# Altium schematic symbol library jlcpcb_2025_04_inductors_extended_0603.schlib: 1269 symbols (part 4 of 7)
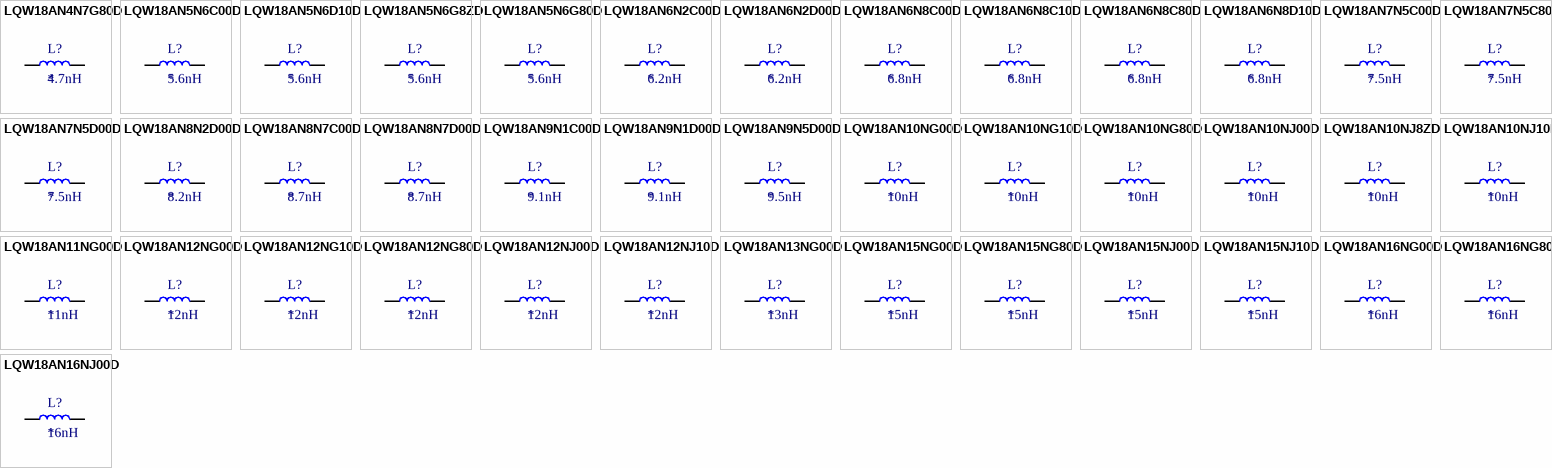
[diagram p34: symbols LQW18AN4N7G80D to LQW18AN16NJ00D]

## LQW18AN6N8C80D
designator L?  Inductance: 6.8nH
Inductor, 6.8nH, 40mΩ, 1.9A, SMD 0603; Manufacturer: Murata Electronics; Manufacturer Part Number: LQW18AN6N8C80D; Package Size: 0603; JLCPCB Basic Part: No; JLCPCB Part Number: C2050361; Supplier 1: LCSC; Category: Inductors; Supplier Part Number 1: C2050361; Rated Current: 1.9A; DC Resistance: 40mΩ; RoHS: Yes; ComponentLink1Description: Datasheet; ComponentLink1URL: https://wmsc.lcsc.com/wmsc/upload/file/pdf/v2/lcsc/2304140030_Murata-Electronics-LQW18AN6N8C80D_C2050361.pdf; ComponentLink2Description: JLCPCB Part URL; ComponentLink2URL: https://jlcpcb.com/partdetail/C2050361; ComponentLink3Description: LCSC Part URL; ComponentLink3URL: https://lcsc.com/product-detail/Power-Inductors_Murata-Electronics-Murata-Electronics-LQW18AN6N8C80D_C2050361.html
footprint IND-0603 (0603 (1608M) Inductor)
pins: 1, 2

## LQW18AN6N8D10D
designator L?  Inductance: 6.8nH
Inductor, 6.8nH, 45mΩ, SMD 0603; Manufacturer: Murata Electronics; Manufacturer Part Number: LQW18AN6N8D10D; Self-Resonant Frequency: 7GHz; Q Factor: 38@250MHz; Package Size: 0603; JLCPCB Basic Part: No; JLCPCB Part Number: C341790; Supplier 1: LCSC; Category: Inductors; Supplier Part Number 1: C341790; DC Resistance: 45mΩ; RoHS: Yes; ComponentLink1Description: Datasheet; ComponentLink1URL: https://wmsc.lcsc.com/wmsc/upload/file/pdf/v2/lcsc/2304140030_Murata-Electronics-LQW18AN6N8D10D_C341790.pdf; ComponentLink2Description: JLCPCB Part URL; ComponentLink2URL: https://jlcpcb.com/partdetail/C341790; ComponentLink3Description: LCSC Part URL; ComponentLink3URL: https://lcsc.com/product-detail/Inductors-SMD_Murata-Electronics-Murata-Electronics-LQW18AN6N8D10D_C341790.html
footprint IND-0603 (0603 (1608M) Inductor)
pins: 1, 2

## LQW18AN7N5C00D
designator L?  Inductance: 7.5nH
Inductor, 7.5nH, 82mΩ, 750mA, SMD 0603; Manufacturer: Murata Electronics; Manufacturer Part Number: LQW18AN7N5C00D; Self-Resonant Frequency: 6GHz; Q Factor: 35@250MHz; Package Size: 0603; JLCPCB Basic Part: No; JLCPCB Part Number: C341696; Supplier 1: LCSC; Category: Inductors; Supplier Part Number 1: C341696; Rated Current: 750mA; DC Resistance: 82mΩ; RoHS: Yes; ComponentLink1Description: Datasheet; ComponentLink1URL: https://wmsc.lcsc.com/wmsc/upload/file/pdf/v2/lcsc/2304140030_Murata-Electronics-LQW18AN7N5C00D_C341696.pdf; ComponentLink2Description: JLCPCB Part URL; ComponentLink2URL: https://jlcpcb.com/partdetail/C341696; ComponentLink3Description: LCSC Part URL; ComponentLink3URL: https://lcsc.com/product-detail/Inductors-SMD_Murata-Electronics-Murata-Electronics-LQW18AN7N5C00D_C341696.html
footprint IND-0603 (0603 (1608M) Inductor)
pins: 1, 2

## LQW18AN7N5C80D
designator L?  Inductance: 7.5nH
Inductor, 7.5nH, 48mΩ, 1.5A, SMD 0603; Manufacturer: Murata Electronics; Manufacturer Part Number: LQW18AN7N5C80D; Package Size: 0603; JLCPCB Basic Part: No; JLCPCB Part Number: C3223406; Supplier 1: LCSC; Category: Inductors; Supplier Part Number 1: C3223406; Rated Current: 1.5A; DC Resistance: 48mΩ; RoHS: Yes; ComponentLink1Description: Datasheet; ComponentLink1URL: https://wmsc.lcsc.com/wmsc/upload/file/pdf/v2/lcsc/2308111531_Murata-Electronics-LQW18AN7N5C80D_C3223406.pdf; ComponentLink2Description: JLCPCB Part URL; ComponentLink2URL: https://jlcpcb.com/partdetail/C3223406; ComponentLink3Description: LCSC Part URL; ComponentLink3URL: https://lcsc.com/product-detail/Power-Inductors_Murata-Electronics-Murata-Electronics-LQW18AN7N5C80D_C3223406.html
footprint IND-0603 (0603 (1608M) Inductor)
pins: 1, 2

## LQW18AN7N5D00D
designator L?  Inductance: 7.5nH
Inductor, 7.5nH, 82mΩ, SMD 0603; Manufacturer: Murata Electronics; Manufacturer Part Number: LQW18AN7N5D00D; Self-Resonant Frequency: 6GHz; Q Factor: 35@250MHz; Package Size: 0603; JLCPCB Basic Part: No; JLCPCB Part Number: C98084; Supplier 1: LCSC; Category: Inductors; Supplier Part Number 1: C98084; DC Resistance: 82mΩ; RoHS: Yes; ComponentLink1Description: Datasheet; ComponentLink1URL: https://wmsc.lcsc.com/wmsc/upload/file/pdf/v2/lcsc/2304140030_Murata-Electronics-LQW18AN7N5D00D_C98084.pdf; ComponentLink2Description: JLCPCB Part URL; ComponentLink2URL: https://jlcpcb.com/partdetail/C98084; ComponentLink3Description: LCSC Part URL; ComponentLink3URL: https://lcsc.com/product-detail/Inductors-SMD_Murata-Electronics-Murata-Electronics-LQW18AN7N5D00D_C98084.html
footprint IND-0603 (0603 (1608M) Inductor)
pins: 1, 2

## LQW18AN8N2D00D
designator L?  Inductance: 8.2nH
Inductor, 8.2nH, 110mΩ, 650mA, SMD 0603; Manufacturer: Murata Electronics; Manufacturer Part Number: LQW18AN8N2D00D; Self-Resonant Frequency: 6GHz; Q Factor: 35@250MHz; Package Size: 0603; JLCPCB Basic Part: No; JLCPCB Part Number: C98087; Supplier 1: LCSC; Category: Inductors; Supplier Part Number 1: C98087; Rated Current: 650mA; DC Resistance: 110mΩ; RoHS: Yes; ComponentLink1Description: Datasheet; ComponentLink1URL: https://wmsc.lcsc.com/wmsc/upload/file/pdf/v2/lcsc/2304140030_Murata-Electronics-LQW18AN8N2D00D_C98087.pdf; ComponentLink2Description: JLCPCB Part URL; ComponentLink2URL: https://jlcpcb.com/partdetail/C98087; ComponentLink3Description: LCSC Part URL; ComponentLink3URL: https://lcsc.com/product-detail/Inductors-SMD_Murata-Electronics-Murata-Electronics-LQW18AN8N2D00D_C98087.html
footprint IND-0603 (0603 (1608M) Inductor)
pins: 1, 2

## LQW18AN8N7C00D
designator L?  Inductance: 8.7nH
Inductor, 8.7nH, 110mΩ, 650mA, SMD 0603; Manufacturer: Murata Electronics; Manufacturer Part Number: LQW18AN8N7C00D; Self-Resonant Frequency: 6GHz; Q Factor: 35@250MHz; Package Size: 0603; JLCPCB Basic Part: No; JLCPCB Part Number: C86137; Supplier 1: LCSC; Category: Inductors; Supplier Part Number 1: C86137; Rated Current: 650mA; DC Resistance: 110mΩ; RoHS: Yes; ComponentLink1Description: Datasheet; ComponentLink1URL: https://wmsc.lcsc.com/wmsc/upload/file/pdf/v2/lcsc/1810311111_Murata-Electronics-LQW18AN8N7C00D_C86137.pdf; ComponentLink2Description: JLCPCB Part URL; ComponentLink2URL: https://jlcpcb.com/partdetail/C86137; ComponentLink3Description: LCSC Part URL; ComponentLink3URL: https://lcsc.com/product-detail/Inductors-SMD_Murata-Electronics-Murata-Electronics-LQW18AN8N7C00D_C86137.html
footprint IND-0603 (0603 (1608M) Inductor)
pins: 1, 2

## LQW18AN8N7D00D
designator L?  Inductance: 8.7nH
Inductor, 8.7nH, 110mΩ, 650mA, SMD 0603; Manufacturer: Murata Electronics; Manufacturer Part Number: LQW18AN8N7D00D; Package Size: 0603; JLCPCB Basic Part: No; JLCPCB Part Number: C701180; Supplier 1: LCSC; Category: Inductors; Supplier Part Number 1: C701180; Rated Current: 650mA; DC Resistance: 110mΩ; RoHS: Yes; ComponentLink1Description: Datasheet; ComponentLink1URL: https://wmsc.lcsc.com/wmsc/upload/file/pdf/v2/lcsc/2009291135_Murata-Electronics-LQW18AN8N7D00D_C701180.pdf; ComponentLink2Description: JLCPCB Part URL; ComponentLink2URL: https://jlcpcb.com/partdetail/C701180; ComponentLink3Description: LCSC Part URL; ComponentLink3URL: https://lcsc.com/product-detail/Power-Inductors_Murata-Electronics-Murata-Electronics-LQW18AN8N7D00D_C701180.html
footprint IND-0603 (0603 (1608M) Inductor)
pins: 1, 2

## LQW18AN9N1C00D
designator L?  Inductance: 9.1nH
Inductor, 9.1nH, 110mΩ, 650mA, SMD 0603; Manufacturer: Murata Electronics; Manufacturer Part Number: LQW18AN9N1C00D; Package Size: 0603; JLCPCB Basic Part: No; JLCPCB Part Number: C701193; Supplier 1: LCSC; Category: Inductors; Supplier Part Number 1: C701193; Rated Current: 650mA; DC Resistance: 110mΩ; RoHS: Yes; ComponentLink1Description: Datasheet; ComponentLink1URL: https://wmsc.lcsc.com/wmsc/upload/file/pdf/v2/lcsc/2009241508_Murata-Electronics-LQW18AN9N1C00D_C701193.pdf; ComponentLink2Description: JLCPCB Part URL; ComponentLink2URL: https://jlcpcb.com/partdetail/C701193; ComponentLink3Description: LCSC Part URL; ComponentLink3URL: https://lcsc.com/product-detail/Power-Inductors_Murata-Electronics-Murata-Electronics-LQW18AN9N1C00D_C701193.html
footprint IND-0603 (0603 (1608M) Inductor)
pins: 1, 2

## LQW18AN9N1D00D
designator L?  Inductance: 9.1nH
Inductor, 9.1nH, 110mΩ, 650mA, SMD 0603; Manufacturer: Murata Electronics; Manufacturer Part Number: LQW18AN9N1D00D; Self-Resonant Frequency: 6GHz; Q Factor: 35@250MHz; Package Size: 0603; JLCPCB Basic Part: No; JLCPCB Part Number: C77125; Supplier 1: LCSC; Category: Inductors; Supplier Part Number 1: C77125; Rated Current: 650mA; DC Resistance: 110mΩ; RoHS: Yes; ComponentLink1Description: Datasheet; ComponentLink1URL: https://wmsc.lcsc.com/wmsc/upload/file/pdf/v2/lcsc/2304140030_Murata-Electronics-LQW18AN9N1D00D_C77125.pdf; ComponentLink2Description: JLCPCB Part URL; ComponentLink2URL: https://jlcpcb.com/partdetail/C77125; ComponentLink3Description: LCSC Part URL; ComponentLink3URL: https://lcsc.com/product-detail/Inductors-SMD_Murata-Electronics-Murata-Electronics-LQW18AN9N1D00D_C77125.html
footprint IND-0603 (0603 (1608M) Inductor)
pins: 1, 2

## LQW18AN9N5D00D
designator L?  Inductance: 9.5nH
Inductor, 9.5nH, 110mΩ, 650mA, SMD 0603; Manufacturer: Murata Electronics; Manufacturer Part Number: LQW18AN9N5D00D; Package Size: 0603; JLCPCB Basic Part: No; JLCPCB Part Number: C701179; Supplier 1: LCSC; Category: Inductors; Supplier Part Number 1: C701179; Rated Current: 650mA; DC Resistance: 110mΩ; RoHS: Yes; ComponentLink1Description: Datasheet; ComponentLink1URL: https://wmsc.lcsc.com/wmsc/upload/file/pdf/v2/lcsc/2009291135_Murata-Electronics-LQW18AN9N5D00D_C701179.pdf; ComponentLink2Description: JLCPCB Part URL; ComponentLink2URL: https://jlcpcb.com/partdetail/C701179; ComponentLink3Description: LCSC Part URL; ComponentLink3URL: https://lcsc.com/product-detail/Power-Inductors_Murata-Electronics-Murata-Electronics-LQW18AN9N5D00D_C701179.html
footprint IND-0603 (0603 (1608M) Inductor)
pins: 1, 2

## LQW18AN10NG00D
designator L?  Inductance: 10nH
Inductor, 10nH, ±2%, 110mΩ, 650mA, SMD 0603; Manufacturer: Murata Electronics; Manufacturer Part Number: LQW18AN10NG00D; Self-Resonant Frequency: 6GHz; Q Factor: 35@250MHz; Package Size: 0603; JLCPCB Basic Part: No; JLCPCB Part Number: C86131; Supplier 1: LCSC; Category: Inductors; Supplier Part Number 1: C86131; Tolerance: ±2%; Rated Current: 650mA; DC Resistance: 110mΩ; RoHS: Yes; ComponentLink1Description: Datasheet; ComponentLink1URL: https://wmsc.lcsc.com/wmsc/upload/file/pdf/v2/lcsc/1810311121_Murata-Electronics-LQW18AN10NG00D_C86131.pdf; ComponentLink2Description: JLCPCB Part URL; ComponentLink2URL: https://jlcpcb.com/partdetail/C86131; ComponentLink3Description: LCSC Part URL; ComponentLink3URL: https://lcsc.com/product-detail/Inductors-SMD_Murata-Electronics-Murata-Electronics-LQW18AN10NG00D_C86131.html
footprint IND-0603 (0603 (1608M) Inductor)
pins: 1, 2

## LQW18AN10NG10D
designator L?  Inductance: 10nH
Inductor, 10nH, ±2%, 58mΩ, 800mA, SMD 0603; Manufacturer: Murata Electronics; Manufacturer Part Number: LQW18AN10NG10D; Package Size: 0603; JLCPCB Basic Part: No; JLCPCB Part Number: C417140; Supplier 1: LCSC; Category: Inductors; Supplier Part Number 1: C417140; Tolerance: ±2%; Rated Current: 800mA; DC Resistance: 58mΩ; RoHS: Yes; ComponentLink1Description: Datasheet; ComponentLink1URL: https://wmsc.lcsc.com/wmsc/upload/file/pdf/v2/lcsc/2009241507_Murata-Electronics-LQW18AN10NG10D_C417140.pdf; ComponentLink2Description: JLCPCB Part URL; ComponentLink2URL: https://jlcpcb.com/partdetail/C417140; ComponentLink3Description: LCSC Part URL; ComponentLink3URL: https://lcsc.com/product-detail/Power-Inductors_Murata-Electronics-Murata-Electronics-LQW18AN10NG10D_C417140.html
footprint IND-0603 (0603 (1608M) Inductor)
pins: 1, 2

## LQW18AN10NG80D
designator L?  Inductance: 10nH
Inductor, 10nH, ±2%, 52mΩ, 1.6A, SMD 0603; Manufacturer: Murata Electronics; Manufacturer Part Number: LQW18AN10NG80D; Package Size: 0603; JLCPCB Basic Part: No; JLCPCB Part Number: C668467; Supplier 1: LCSC; Category: Inductors; Supplier Part Number 1: C668467; Tolerance: ±2%; Rated Current: 1.6A; DC Resistance: 52mΩ; RoHS: Yes; ComponentLink1Description: Datasheet; ComponentLink1URL: https://wmsc.lcsc.com/wmsc/upload/file/pdf/v2/lcsc/2107272240_Murata-Electronics-LQW18AN10NG80D_C668467.pdf; ComponentLink2Description: JLCPCB Part URL; ComponentLink2URL: https://jlcpcb.com/partdetail/C668467; ComponentLink3Description: LCSC Part URL; ComponentLink3URL: https://lcsc.com/product-detail/Power-Inductors_Murata-Electronics-Murata-Electronics-LQW18AN10NG80D_C668467.html
footprint IND-0603 (0603 (1608M) Inductor)
pins: 1, 2

## LQW18AN10NJ00D
designator L?  Inductance: 10nH
Inductor, 10nH, ±5%, 110mΩ, 650mA, SMD 0603; Manufacturer: Murata Electronics; Manufacturer Part Number: LQW18AN10NJ00D; Self-Resonant Frequency: 6GHz; Q Factor: 35@250MHz; Package Size: 0603; JLCPCB Basic Part: No; JLCPCB Part Number: C98067; Supplier 1: LCSC; Category: Inductors; Supplier Part Number 1: C98067; Tolerance: ±5%; Rated Current: 650mA; DC Resistance: 110mΩ; RoHS: Yes; ComponentLink1Description: Datasheet; ComponentLink1URL: https://wmsc.lcsc.com/wmsc/upload/file/pdf/v2/lcsc/2304140030_Murata-Electronics-LQW18AN10NJ00D_C98067.pdf; ComponentLink2Description: JLCPCB Part URL; ComponentLink2URL: https://jlcpcb.com/partdetail/C98067; ComponentLink3Description: LCSC Part URL; ComponentLink3URL: https://lcsc.com/product-detail/Inductors-SMD_Murata-Electronics-Murata-Electronics-LQW18AN10NJ00D_C98067.html
footprint IND-0603 (0603 (1608M) Inductor)
pins: 1, 2

## LQW18AN10NJ8ZD
designator L?  Inductance: 10nH
Inductor, 10nH, ±5%, 52mΩ, 1.6A, SMD 0603; Manufacturer: Murata Electronics; Manufacturer Part Number: LQW18AN10NJ8ZD; Self-Resonant Frequency: 4.75GHz; Q Factor: 38@250MHz; Package Size: 0603; JLCPCB Basic Part: No; JLCPCB Part Number: C1329668; Supplier 1: LCSC; Category: Inductors; Supplier Part Number 1: C1329668; Tolerance: ±5%; Rated Current: 1.6A; DC Resistance: 52mΩ; RoHS: Yes; ComponentLink1Description: Datasheet; ComponentLink1URL: https://wmsc.lcsc.com/wmsc/upload/file/pdf/v2/lcsc/2304140030_Murata-Electronics-LQW18AN10NJ8ZD_C1329668.pdf; ComponentLink2Description: JLCPCB Part URL; ComponentLink2URL: https://jlcpcb.com/partdetail/C1329668; ComponentLink3Description: LCSC Part URL; ComponentLink3URL: https://lcsc.com/product-detail/Inductors-SMD_Murata-Electronics-Murata-Electronics-LQW18AN10NJ8ZD_C1329668.html
footprint IND-0603 (0603 (1608M) Inductor)
pins: 1, 2

## LQW18AN10NJ10D
designator L?  Inductance: 10nH
Inductor, 10nH, ±5%, 58mΩ, 800mA, SMD 0603; Manufacturer: Murata Electronics; Manufacturer Part Number: LQW18AN10NJ10D; Package Size: 0603; JLCPCB Basic Part: No; JLCPCB Part Number: C913709; Supplier 1: LCSC; Category: Inductors; Supplier Part Number 1: C913709; Tolerance: ±5%; Rated Current: 800mA; DC Resistance: 58mΩ; RoHS: Yes; ComponentLink1Description: Datasheet; ComponentLink1URL: https://wmsc.lcsc.com/wmsc/upload/file/pdf/v2/lcsc/2201131300_Murata-Electronics-LQW18AN10NJ10D_C913709.pdf; ComponentLink2Description: JLCPCB Part URL; ComponentLink2URL: https://jlcpcb.com/partdetail/C913709; ComponentLink3Description: LCSC Part URL; ComponentLink3URL: https://lcsc.com/product-detail/Power-Inductors_Murata-Electronics-Murata-Electronics-LQW18AN10NJ10D_C913709.html
footprint IND-0603 (0603 (1608M) Inductor)
pins: 1, 2

## LQW18AN11NG00D
designator L?  Inductance: 11nH
Inductor, 11nH, ±2%, 110mΩ, 650mA, SMD 0603; Manufacturer: Murata Electronics; Manufacturer Part Number: LQW18AN11NG00D; Self-Resonant Frequency: 6GHz; Q Factor: 35@250MHz; Package Size: 0603; JLCPCB Basic Part: No; JLCPCB Part Number: C701196; Supplier 1: LCSC; Category: Inductors; Supplier Part Number 1: C701196; Tolerance: ±2%; Rated Current: 650mA; DC Resistance: 110mΩ; RoHS: Yes; ComponentLink1Description: Datasheet; ComponentLink1URL: https://wmsc.lcsc.com/wmsc/upload/file/pdf/v2/lcsc/2007281834_Murata-Electronics-LQW18AN11NG00D_C701196.pdf; ComponentLink2Description: JLCPCB Part URL; ComponentLink2URL: https://jlcpcb.com/partdetail/C701196; ComponentLink3Description: LCSC Part URL; ComponentLink3URL: https://lcsc.com/product-detail/Inductors-SMD_Murata-Electronics-Murata-Electronics-LQW18AN11NG00D_C701196.html
footprint IND-0603 (0603 (1608M) Inductor)
pins: 1, 2

## LQW18AN12NG00D
designator L?  Inductance: 12nH
Inductor, 12nH, ±2%, 130mΩ, SMD 0603; Manufacturer: Murata Electronics; Manufacturer Part Number: LQW18AN12NG00D; Self-Resonant Frequency: 6GHz; Q Factor: 35@250MHz; Package Size: 0603; JLCPCB Basic Part: No; JLCPCB Part Number: C98068; Supplier 1: LCSC; Category: Inductors; Supplier Part Number 1: C98068; Tolerance: ±2%; DC Resistance: 130mΩ; RoHS: Yes; ComponentLink1Description: Datasheet; ComponentLink1URL: https://wmsc.lcsc.com/wmsc/upload/file/pdf/v2/lcsc/2304140030_Murata-Electronics-LQW18AN12NG00D_C98068.pdf; ComponentLink2Description: JLCPCB Part URL; ComponentLink2URL: https://jlcpcb.com/partdetail/C98068; ComponentLink3Description: LCSC Part URL; ComponentLink3URL: https://lcsc.com/product-detail/Inductors-SMD_Murata-Electronics-Murata-Electronics-LQW18AN12NG00D_C98068.html
footprint IND-0603 (0603 (1608M) Inductor)
pins: 1, 2

## LQW18AN12NG10D
designator L?  Inductance: 12nH
Inductor, 12nH, ±2%, 71mΩ, 750mA, SMD 0603; Manufacturer: Murata Electronics; Manufacturer Part Number: LQW18AN12NG10D; Package Size: 0603; JLCPCB Basic Part: No; JLCPCB Part Number: C440240; Supplier 1: LCSC; Category: Inductors; Supplier Part Number 1: C440240; Tolerance: ±2%; Rated Current: 750mA; DC Resistance: 71mΩ; RoHS: Yes; ComponentLink1Description: Datasheet; ComponentLink1URL: https://wmsc.lcsc.com/wmsc/upload/file/pdf/v2/lcsc/2304140030_Murata-Electronics-LQW18AN12NG10D_C440240.pdf; ComponentLink2Description: JLCPCB Part URL; ComponentLink2URL: https://jlcpcb.com/partdetail/C440240; ComponentLink3Description: LCSC Part URL; ComponentLink3URL: https://lcsc.com/product-detail/Power-Inductors_Murata-Electronics-Murata-Electronics-LQW18AN12NG10D_C440240.html
footprint IND-0603 (0603 (1608M) Inductor)
pins: 1, 2

## LQW18AN12NG80D
designator L?  Inductance: 12nH
Inductor, 12nH, ±2%, 64mΩ, 1.5A, SMD 0603; Manufacturer: Murata Electronics; Manufacturer Part Number: LQW18AN12NG80D; Package Size: 0603; JLCPCB Basic Part: No; JLCPCB Part Number: C341691; Supplier 1: LCSC; Category: Inductors; Supplier Part Number 1: C341691; Tolerance: ±2%; Rated Current: 1.5A; DC Resistance: 64mΩ; RoHS: Yes; ComponentLink1Description: Datasheet; ComponentLink1URL: https://wmsc.lcsc.com/wmsc/upload/file/pdf/v2/lcsc/2301111909_Murata-Electronics-LQW18AN12NG80D_C341691.pdf; ComponentLink2Description: JLCPCB Part URL; ComponentLink2URL: https://jlcpcb.com/partdetail/C341691; ComponentLink3Description: LCSC Part URL; ComponentLink3URL: https://lcsc.com/product-detail/Power-Inductors_Murata-Electronics-Murata-Electronics-LQW18AN12NG80D_C341691.html
footprint IND-0603 (0603 (1608M) Inductor)
pins: 1, 2

## LQW18AN12NJ00D
designator L?  Inductance: 12nH
Inductor, 12nH, ±5%, 130mΩ, 600mA, SMD 0603; Manufacturer: Murata Electronics; Manufacturer Part Number: LQW18AN12NJ00D; Package Size: 0603; JLCPCB Basic Part: No; JLCPCB Part Number: C701185; Supplier 1: LCSC; Category: Inductors; Supplier Part Number 1: C701185; Tolerance: ±5%; Rated Current: 600mA; DC Resistance: 130mΩ; RoHS: Yes; ComponentLink1Description: Datasheet; ComponentLink1URL: https://wmsc.lcsc.com/wmsc/upload/file/pdf/v2/lcsc/2012071939_Murata-Electronics-LQW18AN12NJ00D_C701185.pdf; ComponentLink2Description: JLCPCB Part URL; ComponentLink2URL: https://jlcpcb.com/partdetail/C701185; ComponentLink3Description: LCSC Part URL; ComponentLink3URL: https://lcsc.com/product-detail/Power-Inductors_Murata-Electronics-Murata-Electronics-LQW18AN12NJ00D_C701185.html
footprint IND-0603 (0603 (1608M) Inductor)
pins: 1, 2

## LQW18AN12NJ10D
designator L?  Inductance: 12nH
Inductor, 12nH, ±5%, 71mΩ, 750mA, SMD 0603; Manufacturer: Murata Electronics; Manufacturer Part Number: LQW18AN12NJ10D; Self-Resonant Frequency: 5GHz; Q Factor: 38@250MHz; Package Size: 0603; JLCPCB Basic Part: No; JLCPCB Part Number: C341692; Supplier 1: LCSC; Category: Inductors; Supplier Part Number 1: C341692; Tolerance: ±5%; Rated Current: 750mA; DC Resistance: 71mΩ; RoHS: Yes; ComponentLink1Description: Datasheet; ComponentLink1URL: https://wmsc.lcsc.com/wmsc/upload/file/pdf/v2/lcsc/2304140030_Murata-Electronics-LQW18AN12NJ10D_C341692.pdf; ComponentLink2Description: JLCPCB Part URL; ComponentLink2URL: https://jlcpcb.com/partdetail/C341692; ComponentLink3Description: LCSC Part URL; ComponentLink3URL: https://lcsc.com/product-detail/Inductors-SMD_Murata-Electronics-Murata-Electronics-LQW18AN12NJ10D_C341692.html
footprint IND-0603 (0603 (1608M) Inductor)
pins: 1, 2

## LQW18AN13NG00D
designator L?  Inductance: 13nH
Inductor, 13nH, ±2%, 130mΩ, 600mA, SMD 0603; Manufacturer: Murata Electronics; Manufacturer Part Number: LQW18AN13NG00D; Self-Resonant Frequency: 6GHz; Q Factor: 35@250MHz; Package Size: 0603; JLCPCB Basic Part: No; JLCPCB Part Number: C701184; Supplier 1: LCSC; Category: Inductors; Supplier Part Number 1: C701184; Tolerance: ±2%; Rated Current: 600mA; DC Resistance: 130mΩ; RoHS: Yes; ComponentLink1Description: Datasheet; ComponentLink1URL: https://wmsc.lcsc.com/wmsc/upload/file/pdf/v2/lcsc/2009291135_Murata-Electronics-LQW18AN13NG00D_C701184.pdf; ComponentLink2Description: JLCPCB Part URL; ComponentLink2URL: https://jlcpcb.com/partdetail/C701184; ComponentLink3Description: LCSC Part URL; ComponentLink3URL: https://lcsc.com/product-detail/Inductors-SMD_Murata-Electronics-Murata-Electronics-LQW18AN13NG00D_C701184.html
footprint IND-0603 (0603 (1608M) Inductor)
pins: 1, 2

## LQW18AN15NG00D
designator L?  Inductance: 15nH
Inductor, 15nH, ±2%, 130mΩ, SMD 0603; Manufacturer: Murata Electronics; Manufacturer Part Number: LQW18AN15NG00D; Self-Resonant Frequency: 6GHz; Q Factor: 40@250MHz; Package Size: 0603; JLCPCB Basic Part: No; JLCPCB Part Number: C86132; Supplier 1: LCSC; Category: Inductors; Supplier Part Number 1: C86132; Tolerance: ±2%; DC Resistance: 130mΩ; RoHS: Yes; ComponentLink1Description: Datasheet; ComponentLink1URL: https://wmsc.lcsc.com/wmsc/upload/file/pdf/v2/lcsc/1810311111_Murata-Electronics-LQW18AN15NG00D_C86132.pdf; ComponentLink2Description: JLCPCB Part URL; ComponentLink2URL: https://jlcpcb.com/partdetail/C86132; ComponentLink3Description: LCSC Part URL; ComponentLink3URL: https://lcsc.com/product-detail/Inductors-SMD_Murata-Electronics-Murata-Electronics-LQW18AN15NG00D_C86132.html
footprint IND-0603 (0603 (1608M) Inductor)
pins: 1, 2

## LQW18AN15NG80D
designator L?  Inductance: 15nH
Inductor, 15nH, ±2%, 75mΩ, 1.4A, SMD 0603; Manufacturer: Murata Electronics; Manufacturer Part Number: LQW18AN15NG80D; Package Size: 0603; JLCPCB Basic Part: No; JLCPCB Part Number: C668468; Supplier 1: LCSC; Category: Inductors; Supplier Part Number 1: C668468; Tolerance: ±2%; Rated Current: 1.4A; DC Resistance: 75mΩ; RoHS: Yes; ComponentLink1Description: Datasheet; ComponentLink1URL: https://wmsc.lcsc.com/wmsc/upload/file/pdf/v2/lcsc/2105241313_Murata-Electronics-LQW18AN15NG80D_C668468.pdf; ComponentLink2Description: JLCPCB Part URL; ComponentLink2URL: https://jlcpcb.com/partdetail/C668468; ComponentLink3Description: LCSC Part URL; ComponentLink3URL: https://lcsc.com/product-detail/Power-Inductors_Murata-Electronics-Murata-Electronics-LQW18AN15NG80D_C668468.html
footprint IND-0603 (0603 (1608M) Inductor)
pins: 1, 2

## LQW18AN15NJ00D
designator L?  Inductance: 15nH
Inductor, 15nH, ±5%, 130mΩ, 600mA, SMD 0603; Manufacturer: Murata Electronics; Manufacturer Part Number: LQW18AN15NJ00D; Self-Resonant Frequency: 6GHz; Q Factor: 40@250MHz; Package Size: 0603; JLCPCB Basic Part: No; JLCPCB Part Number: C98069; Supplier 1: LCSC; Category: Inductors; Supplier Part Number 1: C98069; Tolerance: ±5%; Rated Current: 600mA; DC Resistance: 130mΩ; RoHS: Yes; ComponentLink1Description: Datasheet; ComponentLink1URL: https://wmsc.lcsc.com/wmsc/upload/file/pdf/v2/lcsc/2304140030_Murata-Electronics-LQW18AN15NJ00D_C98069.pdf; ComponentLink2Description: JLCPCB Part URL; ComponentLink2URL: https://jlcpcb.com/partdetail/C98069; ComponentLink3Description: LCSC Part URL; ComponentLink3URL: https://lcsc.com/product-detail/Inductors-SMD_Murata-Electronics-Murata-Electronics-LQW18AN15NJ00D_C98069.html
footprint IND-0603 (0603 (1608M) Inductor)
pins: 1, 2

## LQW18AN15NJ10D
designator L?  Inductance: 15nH
Inductor, 15nH, ±5%, 85mΩ, 700mA, SMD 0603; Manufacturer: Murata Electronics; Manufacturer Part Number: LQW18AN15NJ10D; Package Size: 0603; JLCPCB Basic Part: No; JLCPCB Part Number: C341693; Supplier 1: LCSC; Category: Inductors; Supplier Part Number 1: C341693; Tolerance: ±5%; Rated Current: 700mA; DC Resistance: 85mΩ; RoHS: Yes; ComponentLink1Description: Datasheet; ComponentLink1URL: https://wmsc.lcsc.com/wmsc/upload/file/pdf/v2/lcsc/2304140030_Murata-Electronics-LQW18AN15NJ10D_C341693.pdf; ComponentLink2Description: JLCPCB Part URL; ComponentLink2URL: https://jlcpcb.com/partdetail/C341693; ComponentLink3Description: LCSC Part URL; ComponentLink3URL: https://lcsc.com/product-detail/Power-Inductors_Murata-Electronics-Murata-Electronics-LQW18AN15NJ10D_C341693.html
footprint IND-0603 (0603 (1608M) Inductor)
pins: 1, 2

## LQW18AN16NG00D
designator L?  Inductance: 16nH
Inductor, 16nH, ±2%, 160mΩ, SMD 0603; Manufacturer: Murata Electronics; Manufacturer Part Number: LQW18AN16NG00D; Self-Resonant Frequency: 5.5GHz; Q Factor: 40@250MHz; Package Size: 0603; JLCPCB Basic Part: No; JLCPCB Part Number: C237581; Supplier 1: LCSC; Category: Inductors; Supplier Part Number 1: C237581; Tolerance: ±2%; DC Resistance: 160mΩ; RoHS: Yes; ComponentLink1Description: Datasheet; ComponentLink1URL: https://wmsc.lcsc.com/wmsc/upload/file/pdf/v2/lcsc/2304140030_Murata-Electronics-LQW18AN16NG00D_C237581.pdf; ComponentLink2Description: JLCPCB Part URL; ComponentLink2URL: https://jlcpcb.com/partdetail/C237581; ComponentLink3Description: LCSC Part URL; ComponentLink3URL: https://lcsc.com/product-detail/Inductors-SMD_Murata-Electronics-Murata-Electronics-LQW18AN16NG00D_C237581.html
footprint IND-0603 (0603 (1608M) Inductor)
pins: 1, 2

## LQW18AN16NG80D
designator L?  Inductance: 16nH
Inductor, 16nH, ±2%, 75mΩ, 1.4A, SMD 0603; Manufacturer: Murata Electronics; Manufacturer Part Number: LQW18AN16NG80D; Package Size: 0603; JLCPCB Basic Part: No; JLCPCB Part Number: C2048889; Supplier 1: LCSC; Category: Inductors; Supplier Part Number 1: C2048889; Tolerance: ±2%; Rated Current: 1.4A; DC Resistance: 75mΩ; RoHS: Yes; ComponentLink1Description: Datasheet; ComponentLink1URL: https://wmsc.lcsc.com/wmsc/upload/file/pdf/v2/lcsc/2304140030_Murata-Electronics-LQW18AN16NG80D_C2048889.pdf; ComponentLink2Description: JLCPCB Part URL; ComponentLink2URL: https://jlcpcb.com/partdetail/C2048889; ComponentLink3Description: LCSC Part URL; ComponentLink3URL: https://lcsc.com/product-detail/Power-Inductors_Murata-Electronics-Murata-Electronics-LQW18AN16NG80D_C2048889.html
footprint IND-0603 (0603 (1608M) Inductor)
pins: 1, 2

## LQW18AN16NJ00D
designator L?  Inductance: 16nH
Inductor, 16nH, ±5%, 160mΩ, SMD 0603; Manufacturer: Murata Electronics; Manufacturer Part Number: LQW18AN16NJ00D; Self-Resonant Frequency: 5.5GHz; Q Factor: 40@250MHz; Package Size: 0603; JLCPCB Basic Part: No; JLCPCB Part Number: C162642; Supplier 1: LCSC; Category: Inductors; Supplier Part Number 1: C162642; Tolerance: ±5%; DC Resistance: 160mΩ; RoHS: Yes; ComponentLink1Description: Datasheet; ComponentLink1URL: https://wmsc.lcsc.com/wmsc/upload/file/pdf/v2/lcsc/2304140030_Murata-Electronics-LQW18AN16NJ00D_C162642.pdf; ComponentLink2Description: JLCPCB Part URL; ComponentLink2URL: https://jlcpcb.com/partdetail/C162642; ComponentLink3Description: LCSC Part URL; ComponentLink3URL: https://lcsc.com/product-detail/Inductors-SMD_Murata-Electronics-Murata-Electronics-LQW18AN16NJ00D_C162642.html
footprint IND-0603 (0603 (1608M) Inductor)
pins: 1, 2

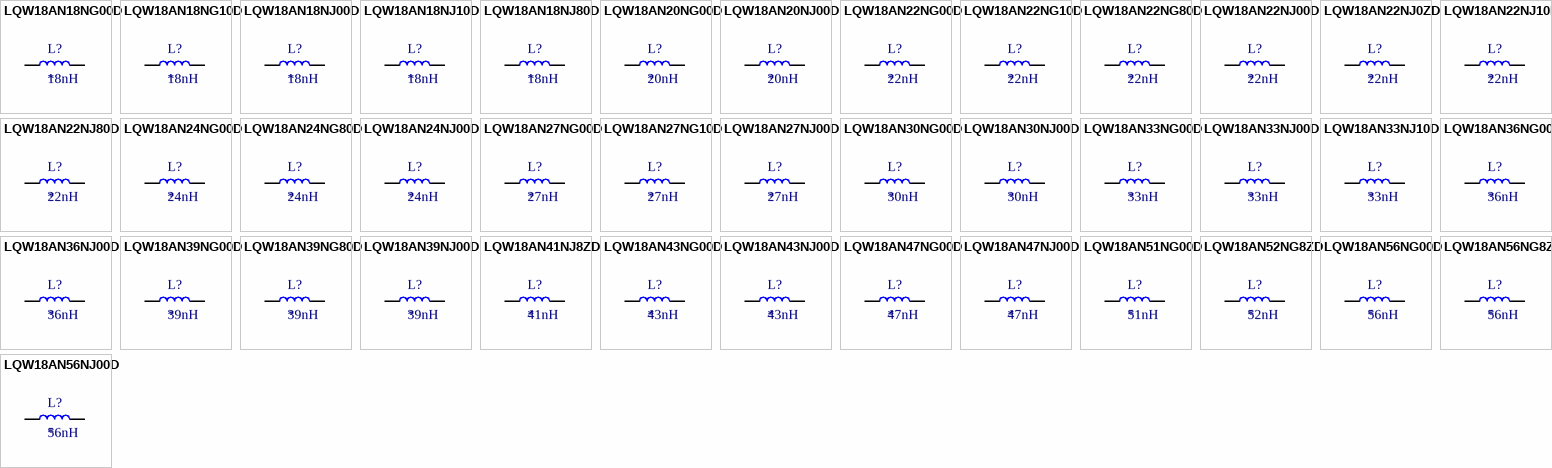
[diagram p15: symbols LQW18AN18NG00D to LQW18AN56NJ00D]

## LQW18AN18NG00D
designator L?  Inductance: 18nH
Inductor, 18nH, ±2%, 160mΩ, 550mA, SMD 0603; Manufacturer: Murata Electronics; Manufacturer Part Number: LQW18AN18NG00D; Self-Resonant Frequency: 5.5GHz; Q Factor: 40@250MHz; Package Size: 0603; JLCPCB Basic Part: No; JLCPCB Part Number: C86133; Supplier 1: LCSC; Category: Inductors; Supplier Part Number 1: C86133; Tolerance: ±2%; Rated Current: 550mA; DC Resistance: 160mΩ; RoHS: Yes; ComponentLink1Description: Datasheet; ComponentLink1URL: https://wmsc.lcsc.com/wmsc/upload/file/pdf/v2/lcsc/2304140030_Murata-Electronics-LQW18AN18NG00D_C86133.pdf; ComponentLink2Description: JLCPCB Part URL; ComponentLink2URL: https://jlcpcb.com/partdetail/C86133; ComponentLink3Description: LCSC Part URL; ComponentLink3URL: https://lcsc.com/product-detail/Inductors-SMD_Murata-Electronics-Murata-Electronics-LQW18AN18NG00D_C86133.html
footprint IND-0603 (0603 (1608M) Inductor)
pins: 1, 2

## LQW18AN18NG10D
designator L?  Inductance: 18nH
Inductor, 18nH, ±2%, 85mΩ, 700mA, SMD 0603; Manufacturer: Murata Electronics; Manufacturer Part Number: LQW18AN18NG10D; Package Size: 0603; JLCPCB Basic Part: No; JLCPCB Part Number: C440241; Supplier 1: LCSC; Category: Inductors; Supplier Part Number 1: C440241; Tolerance: ±2%; Rated Current: 700mA; DC Resistance: 85mΩ; RoHS: Yes; ComponentLink1Description: Datasheet; ComponentLink1URL: https://wmsc.lcsc.com/wmsc/upload/file/pdf/v2/lcsc/2304140030_Murata-Electronics-LQW18AN18NG10D_C440241.pdf; ComponentLink2Description: JLCPCB Part URL; ComponentLink2URL: https://jlcpcb.com/partdetail/C440241; ComponentLink3Description: LCSC Part URL; ComponentLink3URL: https://lcsc.com/product-detail/Power-Inductors_Murata-Electronics-Murata-Electronics-LQW18AN18NG10D_C440241.html
footprint IND-0603 (0603 (1608M) Inductor)
pins: 1, 2

## LQW18AN18NJ00D
designator L?  Inductance: 18nH
Inductor, 18nH, ±5%, 160mΩ, SMD 0603; Manufacturer: Murata Electronics; Manufacturer Part Number: LQW18AN18NJ00D; Self-Resonant Frequency: 5.5GHz; Q Factor: 40@250MHz; Package Size: 0603; JLCPCB Basic Part: No; JLCPCB Part Number: C113263; Supplier 1: LCSC; Category: Inductors; Supplier Part Number 1: C113263; Tolerance: ±5%; DC Resistance: 160mΩ; RoHS: Yes; ComponentLink1Description: Datasheet; ComponentLink1URL: https://wmsc.lcsc.com/wmsc/upload/file/pdf/v2/lcsc/1810311140_Murata-Electronics-LQW18AN18NJ00D_C113263.pdf; ComponentLink2Description: JLCPCB Part URL; ComponentLink2URL: https://jlcpcb.com/partdetail/C113263; ComponentLink3Description: LCSC Part URL; ComponentLink3URL: https://lcsc.com/product-detail/Inductors-SMD_Murata-Electronics-Murata-Electronics-LQW18AN18NJ00D_C113263.html
footprint IND-0603 (0603 (1608M) Inductor)
pins: 1, 2

## LQW18AN18NJ10D
designator L?  Inductance: 18nH
Inductor, 18nH, ±5%, 85mΩ, 700mA, SMD 0603; Manufacturer: Murata Electronics; Manufacturer Part Number: LQW18AN18NJ10D; Self-Resonant Frequency: 3.5GHz; Q Factor: 42@250MHz; Package Size: 0603; JLCPCB Basic Part: No; JLCPCB Part Number: C333991; Supplier 1: LCSC; Category: Inductors; Supplier Part Number 1: C333991; Tolerance: ±5%; Rated Current: 700mA; DC Resistance: 85mΩ; RoHS: Yes; ComponentLink1Description: Datasheet; ComponentLink1URL: https://wmsc.lcsc.com/wmsc/upload/file/pdf/v2/lcsc/1912111437_Murata-Electronics-LQW18AN18NJ10D_C333991.pdf; ComponentLink2Description: JLCPCB Part URL; ComponentLink2URL: https://jlcpcb.com/partdetail/C333991; ComponentLink3Description: LCSC Part URL; ComponentLink3URL: https://lcsc.com/product-detail/Inductors-SMD_Murata-Electronics-Murata-Electronics-LQW18AN18NJ10D_C333991.html
footprint IND-0603 (0603 (1608M) Inductor)
pins: 1, 2

## LQW18AN18NJ80D
designator L?  Inductance: 18nH
Inductor, 18nH, ±5%, 75mΩ, SMD 0603; Manufacturer: Murata Electronics; Manufacturer Part Number: LQW18AN18NJ80D; Self-Resonant Frequency: 4.6GHz; Q Factor: 40@250MHz; Package Size: 0603; JLCPCB Basic Part: No; JLCPCB Part Number: C1332655; Supplier 1: LCSC; Category: Inductors; Supplier Part Number 1: C1332655; Tolerance: ±5%; DC Resistance: 75mΩ; RoHS: Yes; ComponentLink1Description: Datasheet; ComponentLink1URL: https://wmsc.lcsc.com/wmsc/upload/file/pdf/v2/lcsc/2304140030_Murata-Electronics-LQW18AN18NJ80D_C1332655.pdf; ComponentLink2Description: JLCPCB Part URL; ComponentLink2URL: https://jlcpcb.com/partdetail/C1332655; ComponentLink3Description: LCSC Part URL; ComponentLink3URL: https://lcsc.com/product-detail/Inductors-SMD_Murata-Electronics-Murata-Electronics-LQW18AN18NJ80D_C1332655.html
footprint IND-0603 (0603 (1608M) Inductor)
pins: 1, 2

## LQW18AN20NG00D
designator L?  Inductance: 20nH
Inductor, 20nH, ±2%, 160mΩ, 550mA, SMD 0603; Manufacturer: Murata Electronics; Manufacturer Part Number: LQW18AN20NG00D; Self-Resonant Frequency: 4.9GHz; Q Factor: 40@250MHz; Package Size: 0603; JLCPCB Basic Part: No; JLCPCB Part Number: C77124; Supplier 1: LCSC; Category: Inductors; Supplier Part Number 1: C77124; Tolerance: ±2%; Rated Current: 550mA; DC Resistance: 160mΩ; RoHS: Yes; ComponentLink1Description: Datasheet; ComponentLink1URL: https://wmsc.lcsc.com/wmsc/upload/file/pdf/v2/lcsc/2304140030_Murata-Electronics-LQW18AN20NG00D_C77124.pdf; ComponentLink2Description: JLCPCB Part URL; ComponentLink2URL: https://jlcpcb.com/partdetail/C77124; ComponentLink3Description: LCSC Part URL; ComponentLink3URL: https://lcsc.com/product-detail/Inductors-SMD_Murata-Electronics-Murata-Electronics-LQW18AN20NG00D_C77124.html
footprint IND-0603 (0603 (1608M) Inductor)
pins: 1, 2

## LQW18AN20NJ00D
designator L?  Inductance: 20nH
Inductor, 20nH, ±5%, 160mΩ, 550mA, SMD 0603; Manufacturer: Murata Electronics; Manufacturer Part Number: LQW18AN20NJ00D; Self-Resonant Frequency: 4.9GHz; Q Factor: 40@250MHz; Package Size: 0603; JLCPCB Basic Part: No; JLCPCB Part Number: C98070; Supplier 1: LCSC; Category: Inductors; Supplier Part Number 1: C98070; Tolerance: ±5%; Rated Current: 550mA; DC Resistance: 160mΩ; RoHS: Yes; ComponentLink1Description: Datasheet; ComponentLink1URL: https://wmsc.lcsc.com/wmsc/upload/file/pdf/v2/lcsc/2304140030_Murata-Electronics-LQW18AN20NJ00D_C98070.pdf; ComponentLink2Description: JLCPCB Part URL; ComponentLink2URL: https://jlcpcb.com/partdetail/C98070; ComponentLink3Description: LCSC Part URL; ComponentLink3URL: https://lcsc.com/product-detail/Inductors-SMD_Murata-Electronics-Murata-Electronics-LQW18AN20NJ00D_C98070.html
footprint IND-0603 (0603 (1608M) Inductor)
pins: 1, 2

## LQW18AN22NG00D
designator L?  Inductance: 22nH
Inductor, 22nH, ±2%, 170mΩ, SMD 0603; Manufacturer: Murata Electronics; Manufacturer Part Number: LQW18AN22NG00D; Self-Resonant Frequency: 4.6GHz; Q Factor: 40@250MHz; Package Size: 0603; JLCPCB Basic Part: No; JLCPCB Part Number: C84341; Supplier 1: LCSC; Category: Inductors; Supplier Part Number 1: C84341; Tolerance: ±2%; DC Resistance: 170mΩ; RoHS: Yes; ComponentLink1Description: Datasheet; ComponentLink1URL: https://wmsc.lcsc.com/wmsc/upload/file/pdf/v2/lcsc/1811021114_Murata-Electronics-LQW18AN22NG00D_C84341.pdf; ComponentLink2Description: JLCPCB Part URL; ComponentLink2URL: https://jlcpcb.com/partdetail/C84341; ComponentLink3Description: LCSC Part URL; ComponentLink3URL: https://lcsc.com/product-detail/Inductors-SMD_Murata-Electronics-Murata-Electronics-LQW18AN22NG00D_C84341.html
footprint IND-0603 (0603 (1608M) Inductor)
pins: 1, 2

## LQW18AN22NG10D
designator L?  Inductance: 22nH
Inductor, 22nH, ±2%, 99mΩ, 640mA, SMD 0603; Manufacturer: Murata Electronics; Manufacturer Part Number: LQW18AN22NG10D; Self-Resonant Frequency: 3.2GHz; Q Factor: 42@250MHz; Package Size: 0603; JLCPCB Basic Part: No; JLCPCB Part Number: C162643; Supplier 1: LCSC; Category: Inductors; Supplier Part Number 1: C162643; Tolerance: ±2%; Rated Current: 640mA; DC Resistance: 99mΩ; RoHS: Yes; ComponentLink1Description: Datasheet; ComponentLink1URL: https://wmsc.lcsc.com/wmsc/upload/file/pdf/v2/lcsc/1810311126_Murata-Electronics-LQW18AN22NG10D_C162643.pdf; ComponentLink2Description: JLCPCB Part URL; ComponentLink2URL: https://jlcpcb.com/partdetail/C162643; ComponentLink3Description: LCSC Part URL; ComponentLink3URL: https://lcsc.com/product-detail/Inductors-SMD_Murata-Electronics-Murata-Electronics-LQW18AN22NG10D_C162643.html
footprint IND-0603 (0603 (1608M) Inductor)
pins: 1, 2

## LQW18AN22NG80D
designator L?  Inductance: 22nH
Inductor, 22nH, ±2%, 86mΩ, 1.3A, SMD 0603; Manufacturer: Murata Electronics; Manufacturer Part Number: LQW18AN22NG80D; Package Size: 0603; JLCPCB Basic Part: No; JLCPCB Part Number: C2041527; Supplier 1: LCSC; Category: Inductors; Supplier Part Number 1: C2041527; Tolerance: ±2%; Rated Current: 1.3A; DC Resistance: 86mΩ; RoHS: Yes; ComponentLink1Description: Datasheet; ComponentLink1URL: https://wmsc.lcsc.com/wmsc/upload/file/pdf/v2/lcsc/2304140030_Murata-Electronics-LQW18AN22NG80D_C2041527.pdf; ComponentLink2Description: JLCPCB Part URL; ComponentLink2URL: https://jlcpcb.com/partdetail/C2041527; ComponentLink3Description: LCSC Part URL; ComponentLink3URL: https://lcsc.com/product-detail/Power-Inductors_Murata-Electronics-Murata-Electronics-LQW18AN22NG80D_C2041527.html
footprint IND-0603 (0603 (1608M) Inductor)
pins: 1, 2

## LQW18AN22NJ00D
designator L?  Inductance: 22nH
Inductor, 22nH, ±5%, 170mΩ, SMD 0603; Manufacturer: Murata Electronics; Manufacturer Part Number: LQW18AN22NJ00D; Self-Resonant Frequency: 4.6GHz; Q Factor: 40@250MHz; Package Size: 0603; JLCPCB Basic Part: No; JLCPCB Part Number: C98071; Supplier 1: LCSC; Category: Inductors; Supplier Part Number 1: C98071; Tolerance: ±5%; DC Resistance: 170mΩ; RoHS: Yes; ComponentLink1Description: Datasheet; ComponentLink1URL: https://wmsc.lcsc.com/wmsc/upload/file/pdf/v2/lcsc/2304140030_Murata-Electronics-LQW18AN22NJ00D_C98071.pdf; ComponentLink2Description: JLCPCB Part URL; ComponentLink2URL: https://jlcpcb.com/partdetail/C98071; ComponentLink3Description: LCSC Part URL; ComponentLink3URL: https://lcsc.com/product-detail/Inductors-SMD_Murata-Electronics-Murata-Electronics-LQW18AN22NJ00D_C98071.html
footprint IND-0603 (0603 (1608M) Inductor)
pins: 1, 2

## LQW18AN22NJ0ZD
designator L?  Inductance: 22nH
Inductor, 22nH, ±5%, 170mΩ, 500mA, SMD 0603; Manufacturer: Murata Electronics; Manufacturer Part Number: LQW18AN22NJ0ZD; Package Size: 0603; JLCPCB Basic Part: No; JLCPCB Part Number: C437366; Supplier 1: LCSC; Category: Inductors; Supplier Part Number 1: C437366; Tolerance: ±5%; Rated Current: 500mA; DC Resistance: 170mΩ; RoHS: Yes; ComponentLink1Description: Datasheet; ComponentLink1URL: https://wmsc.lcsc.com/wmsc/upload/file/pdf/v2/lcsc/2010291434_Murata-Electronics-LQW18AN22NJ0ZD_C437366.pdf; ComponentLink2Description: JLCPCB Part URL; ComponentLink2URL: https://jlcpcb.com/partdetail/C437366; ComponentLink3Description: LCSC Part URL; ComponentLink3URL: https://lcsc.com/product-detail/Power-Inductors_Murata-Electronics-Murata-Electronics-LQW18AN22NJ0ZD_C437366.html
footprint IND-0603 (0603 (1608M) Inductor)
pins: 1, 2

## LQW18AN22NJ10D
designator L?  Inductance: 22nH
Inductor, 22nH, ±5%, 99mΩ, 640mA, SMD 0603; Manufacturer: Murata Electronics; Manufacturer Part Number: LQW18AN22NJ10D; Package Size: 0603; JLCPCB Basic Part: No; JLCPCB Part Number: C701172; Supplier 1: LCSC; Category: Inductors; Supplier Part Number 1: C701172; Tolerance: ±5%; Rated Current: 640mA; DC Resistance: 99mΩ; RoHS: Yes; ComponentLink1Description: Datasheet; ComponentLink1URL: https://wmsc.lcsc.com/wmsc/upload/file/pdf/v2/lcsc/2009241508_Murata-Electronics-LQW18AN22NJ10D_C701172.pdf; ComponentLink2Description: JLCPCB Part URL; ComponentLink2URL: https://jlcpcb.com/partdetail/C701172; ComponentLink3Description: LCSC Part URL; ComponentLink3URL: https://lcsc.com/product-detail/Power-Inductors_Murata-Electronics-Murata-Electronics-LQW18AN22NJ10D_C701172.html
footprint IND-0603 (0603 (1608M) Inductor)
pins: 1, 2

## LQW18AN22NJ80D
designator L?  Inductance: 22nH
Inductor, 22nH, ±5%, 86mΩ, 1.3A, SMD 0603; Manufacturer: Murata Electronics; Manufacturer Part Number: LQW18AN22NJ80D; Package Size: 0603; JLCPCB Basic Part: No; JLCPCB Part Number: C560049; Supplier 1: LCSC; Category: Inductors; Supplier Part Number 1: C560049; Tolerance: ±5%; Rated Current: 1.3A; DC Resistance: 86mΩ; RoHS: Yes; ComponentLink1Description: Datasheet; ComponentLink1URL: https://wmsc.lcsc.com/wmsc/upload/file/pdf/v2/lcsc/2304140030_Murata-Electronics-LQW18AN22NJ80D_C560049.pdf; ComponentLink2Description: JLCPCB Part URL; ComponentLink2URL: https://jlcpcb.com/partdetail/C560049; ComponentLink3Description: LCSC Part URL; ComponentLink3URL: https://lcsc.com/product-detail/Power-Inductors_Murata-Electronics-Murata-Electronics-LQW18AN22NJ80D_C560049.html
footprint IND-0603 (0603 (1608M) Inductor)
pins: 1, 2

## LQW18AN24NG00D
designator L?  Inductance: 24nH
Inductor, 24nH, ±2%, 210mΩ, 500mA, SMD 0603; Manufacturer: Murata Electronics; Manufacturer Part Number: LQW18AN24NG00D; Self-Resonant Frequency: 3.8GHz; Q Factor: 40@250MHz; Package Size: 0603; JLCPCB Basic Part: No; JLCPCB Part Number: C162644; Supplier 1: LCSC; Category: Inductors; Supplier Part Number 1: C162644; Tolerance: ±2%; Rated Current: 500mA; DC Resistance: 210mΩ; RoHS: Yes; ComponentLink1Description: Datasheet; ComponentLink1URL: https://wmsc.lcsc.com/wmsc/upload/file/pdf/v2/lcsc/1810311126_Murata-Electronics-LQW18AN24NG00D_C162644.pdf; ComponentLink2Description: JLCPCB Part URL; ComponentLink2URL: https://jlcpcb.com/partdetail/C162644; ComponentLink3Description: LCSC Part URL; ComponentLink3URL: https://lcsc.com/product-detail/Inductors-SMD_Murata-Electronics-Murata-Electronics-LQW18AN24NG00D_C162644.html
footprint IND-0603 (0603 (1608M) Inductor)
pins: 1, 2

## LQW18AN24NG80D
designator L?  Inductance: 24nH
Inductor, 24nH, ±2%, 86mΩ, 1.3A, SMD 0603; Manufacturer: Murata Electronics; Manufacturer Part Number: LQW18AN24NG80D; Package Size: 0603; JLCPCB Basic Part: No; JLCPCB Part Number: C2044044; Supplier 1: LCSC; Category: Inductors; Supplier Part Number 1: C2044044; Tolerance: ±2%; Rated Current: 1.3A; DC Resistance: 86mΩ; RoHS: Yes; ComponentLink1Description: Datasheet; ComponentLink1URL: https://wmsc.lcsc.com/wmsc/upload/file/pdf/v2/lcsc/2304140030_Murata-Electronics-LQW18AN24NG80D_C2044044.pdf; ComponentLink2Description: JLCPCB Part URL; ComponentLink2URL: https://jlcpcb.com/partdetail/C2044044; ComponentLink3Description: LCSC Part URL; ComponentLink3URL: https://lcsc.com/product-detail/Power-Inductors_Murata-Electronics-Murata-Electronics-LQW18AN24NG80D_C2044044.html
footprint IND-0603 (0603 (1608M) Inductor)
pins: 1, 2
